# Altium footprint library lib_protel_HC_BOINA.PCBLIB: 726 footprints (part 21 of 46)
Each footprint in its own frame and in the unit in brackets; x right, y up, seen from the top. Pads: shape width x height; smd on the part's side, far side on the other; paste and mask are expansions set on the pad; w line width, h text height; cw(c..) or ccw(c..) is an arc to the next point about the centre after c.
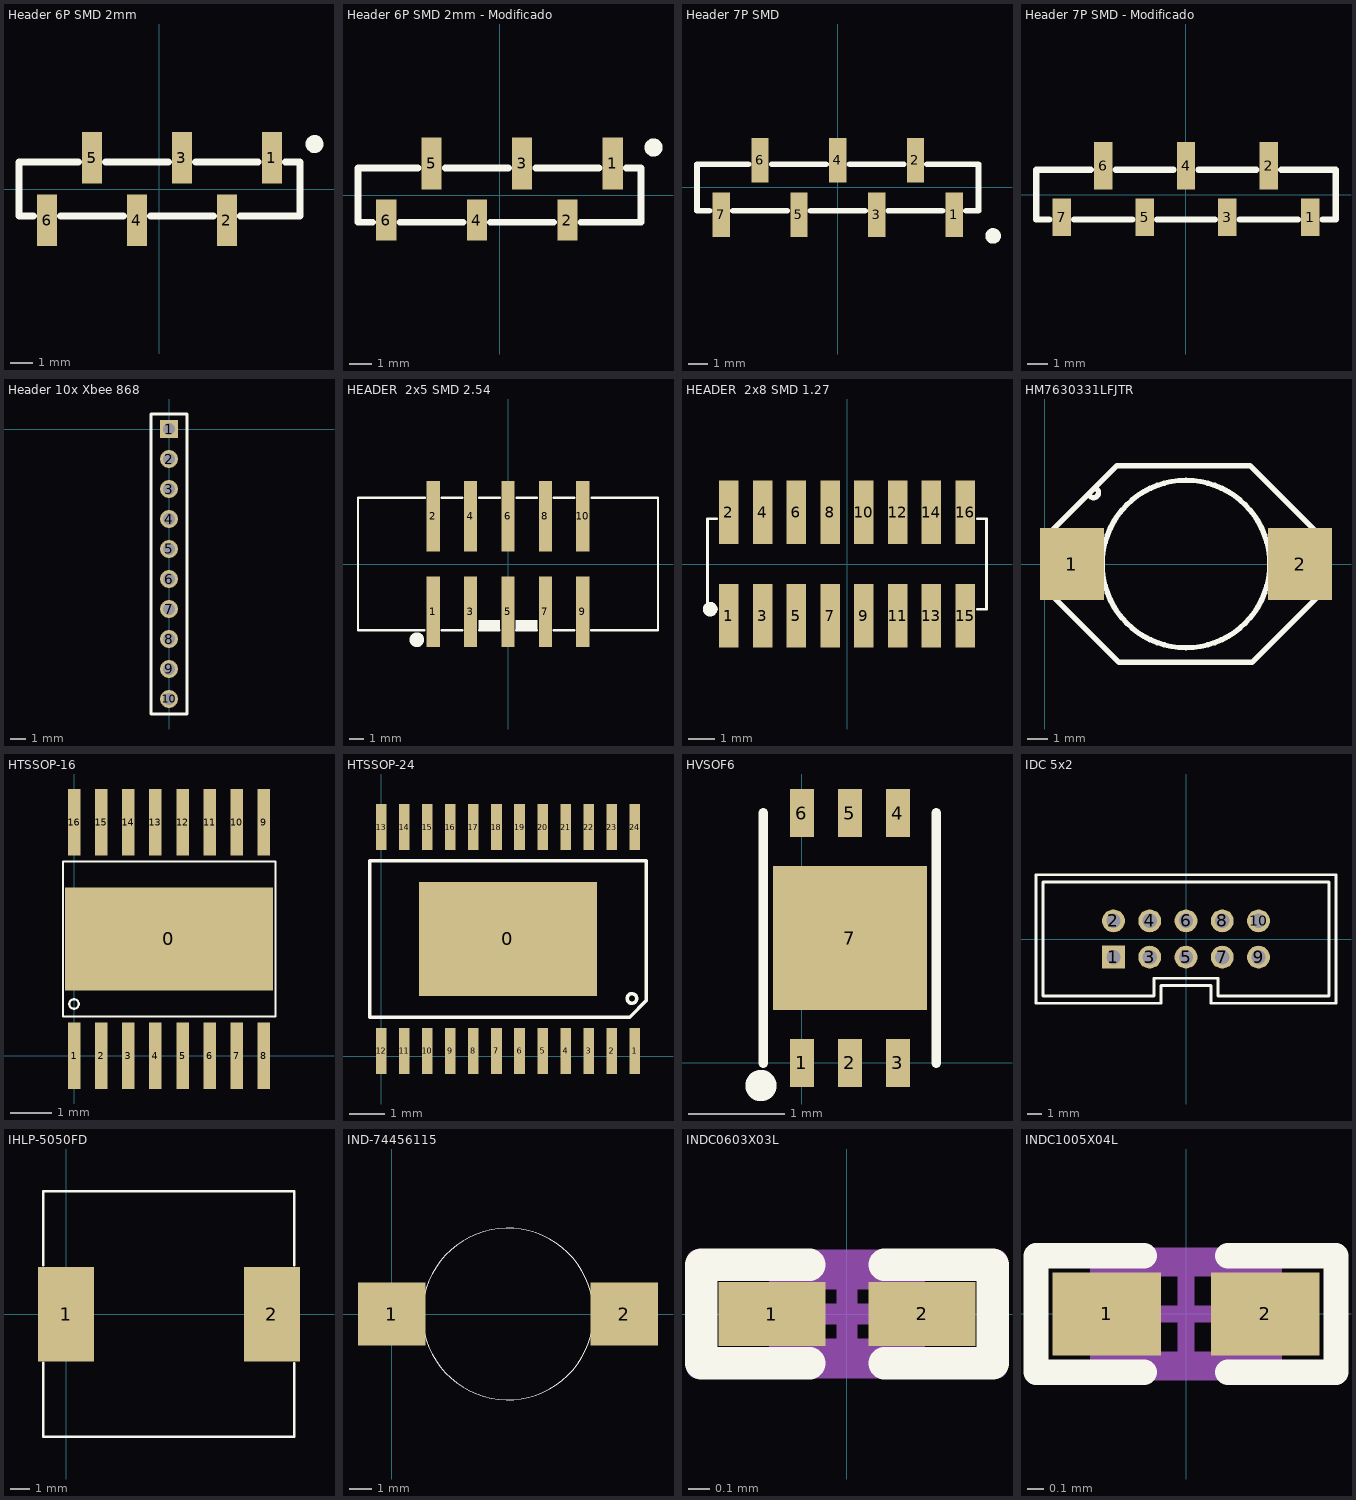
[diagram p20: the footprints below, top view; thin cyan lines are the x and y axes]

## Header 6P SMD 2mm [mm]
height 4.6
pads (6):
  rect 0.89x2.29 smd: 1(5,1.395) 2(3,-1.395) 3(1,1.395) 4(-1,-1.395) 5(-3,1.395) 6(-5,-1.395)
Top Overlay:
  circle w0.4: c6.9,2 r0.2
  lines w0.3: -6.25,1.2 -6.25,-1.2 -5.6,-1.2 ; -6.24,1.2 -3.6,1.2 ; -4.4,-1.2 -1.6,-1.2 ; -2.4,1.2 0.4,1.2 ; -0.4,-1.2 2.4,-1.2 ; 1.6,1.2 4.4,1.2 ; 3.6,-1.2 6.25,-1.2 6.25,1.2 5.6,1.2
3D body "Samtec-SMM-106-02-S-S.step": height 3.56, standoff -0.13, extent -5.997,-2.159 5.997,2.159

## Header 6P SMD 2mm - Modificado [mm]
height 4.6
pads (6):
  rect 0.89x2.29 smd: 1(5,1.395) 3(1,1.395) 5(-3,1.395)
  rect 0.89x1.8 smd: 2(3,-1.105) 4(-1,-1.105) 6(-5,-1.105)
Top Overlay:
  circle w0.4: c6.8,2.1 r0.2
  lines w0.3: -6.25,1.2 -6.25,-1.2 -5.6,-1.2 ; -6.24,1.2 -3.6,1.2 ; -4.4,-1.2 -1.6,-1.2 ; -2.4,1.2 0.4,1.2 ; -0.4,-1.2 2.4,-1.2 ; 1.6,1.2 4.4,1.2 ; 3.6,-1.2 6.25,-1.2 6.25,1.2 5.6,1.2
3D body "Samtec-SMM-106-02-S-S.step": height 3.56, standoff -0.13, extent -5.997,-2.159 5.997,2.159

## Header 7P SMD [mm]
height 4.6
pads (7):
  rect 0.89x2.29 smd: 1(6,-1.395) 2(4,1.395) 3(2,-1.395) 4(0,1.395) 5(-2,-1.395) 6(-4,1.395) 7(-6,-1.395)
Top Overlay:
  circle w0.4: c8,-2.495 r0.2
  lines w0.3: -7.25,1.2 -7.25,-1.2 -6.6,-1.2 ; -7.24,1.2 -4.6,1.2 ; -5.4,-1.2 -2.6,-1.2 ; -3.4,1.2 -0.6,1.2 ; -1.4,-1.2 1.4,-1.2 ; 0.6,1.2 3.4,1.2 ; 2.6,-1.2 5.4,-1.2 ; 4.6,1.2 7.24,1.2 7.24,-1.19 ; 6.6,-1.2 7.25,-1.2

## Header 7P SMD - Modificado [mm]
height 4.6
pads (7):
  rect 0.89x1.8 smd: 1(6,-1.095) 3(2,-1.095) 5(-2,-1.095) 7(-6,-1.095)
  rect 0.89x2.29 smd: 2(4,1.395) 4(0,1.395) 6(-4,1.395)
Top Overlay:
  lines w0.3: -7.25,-1.2 -6.6,-1.2 ; -7.24,-1.19 -7.24,1.2 -4.6,1.2 ; -5.4,-1.2 -2.6,-1.2 ; -3.4,1.2 -0.6,1.2 ; -1.4,-1.2 1.4,-1.2 ; 0.6,1.2 3.4,1.2 ; 2.6,-1.2 5.4,-1.2 ; 4.6,1.2 7.24,1.2 7.24,-1.19 ; 6.6,-1.2 7.25,-1.2
3D body "Samtec-SMM-107-02-F-S-K.step": height 3.84, standoff 0, extent -6.996,-2.159 6.996,2.159

## Header 10x Xbee 868 [mm] "Header Xbee 868MHz 10 pin - 2mm"
height 7.93
pads (10):
  rect 1.2x1.2 hole 0.8: 1(0,0)
  round 1.2 hole 0.8: 2(0,-2) 3(0,-4) 4(0,-6) 5(0,-8) 6(0,-10) 7(0,-12) 8(0,-14) 9(0,-16) 10(0,-18)
Top Overlay:
  lines w0.2: -1.2,-19 -1.2,1 1.2,1 1.2,-19 -1.2,-19
3D body "User Library-PBS2-10-1.STEP": height 4.3, standoff -3.15, extent -1,-19 1,1

## HEADER  2x5 SMD 2.54 [mm]
pads (10):
  rect 0.89x4.8 smd: 1(-5.08,-3.25) 2(-5.08,3.25) 3(-2.54,-3.25) 4(-2.54,3.25) 5(0,-3.25) 6(0,3.25) 7(2.54,-3.25) 8(2.54,3.25) 9(5.08,-3.25) 10(5.08,3.25)
Top Overlay:
  circle w0.5: c-6.2,-5.15 r0.25
  rectangle: -2,-4.5 -0.55,-3.8
  rectangle: 0.5,-4.5 2,-3.8
  lines w0.15: -5.7,-4.5 -10.2,-4.5 -10.2,4.5 -5.65,4.5 ; -4.5,-4.5 -3.1,-4.5 ; -4.5,4.5 -3.1,4.5 ; -1.95,-4.5 -0.6,-4.5 ; -1.95,4.5 -0.55,4.5 ; 0.55,-4.5 1.95,-4.5 ; 0.6,4.5 1.95,4.5 ; 3.1,-4.5 4.5,-4.5 ; 3.1,4.5 4.5,4.5 ; 5.65,-4.5 10.2,-4.5 10.2,4.5 5.7,4.5
3D body "header_awhw10g-smd.stp": height 10.65, standoff 0.01, extent -10.16,-4.725 10.16,4.775

## HEADER  2x8 SMD 1.27 [mm]
pads (16):
  rect 0.74x2.4 smd: 1(-4.445,-1.95) 2(-4.445,1.95) 3(-3.175,-1.95) 4(-3.175,1.95) 5(-1.905,-1.95) 6(-1.905,1.95) 7(-0.635,-1.95) 8(-0.635,1.95) 9(0.635,-1.95) 10(0.635,1.95) 11(1.905,-1.95) 12(1.905,1.95) 13(3.175,-1.95) 14(3.175,1.95) 15(4.445,-1.95) 16(4.445,1.95)
Top Overlay:
  circle w0.25: c-5.15,-1.7 r0.15
  lines w0.1: -4.9,-1.7 -5.25,-1.7 -5.25,1.7 -4.9,1.7 ; 4.9,-1.7 5.25,-1.7 5.25,1.7 4.9,1.7

## HM7630331LFJTR [mm] "BOBINA"
height 5.9
pads (2):
  rect 3.05x3.43 smd mask+0.1: 1(1.3,0) 2(12.2,0)
Top Overlay:
  circle w0.254: c6.75,0 r4
  lines w0.254: 2.108,3.353 ccw(c2.337,3.404) 2.451,3.608 ; 0,-1.143 0,0 0,1.245 3.455,4.7 9.803,4.7 13.5,1.003 13.5,-1.105 9.905,-4.7 3.557,-4.7 0,-1.143

## HTSSOP-16 [mm] "HTSSOP-16 para TPS40055"
height 1.2
pads (17):
  rect 5x2.46 smd mask+0.5: 0(2.275,2.8)
  rect 0.3x1.6 smd mask+0.07: 1(0,0) 2(0.65,0) 3(1.3,0) 4(1.95,0) 5(2.6,0) 6(3.25,0) 7(3.9,0) 8(4.55,0) 9(4.55,5.6) 10(3.9,5.6) 11(3.25,5.6) 12(2.6,5.6) 13(1.95,5.6) 14(1.3,5.6) 15(0.65,5.6) 16(0,5.6)
Top Overlay:
  circle w0.051: c-0.004,1.24 r0.114
  lines w0.051: -0.27,0.94 4.83,0.94 4.83,4.66 -0.27,4.66 -0.27,0.94

## HTSSOP-24 [mm] "HTSSOP-24 para TDA7493"
height 1.2
pads (25):
  rect 5x3.2 smd: 0(3.575,3.3)
  rect 0.3x1.3 smd: 1(7.15,0.15) 2(6.5,0.15) 3(5.85,0.15) 4(5.2,0.15) 5(4.55,0.15) 6(3.9,0.15) 7(3.25,0.15) 8(2.6,0.15) 9(1.95,0.15) 10(1.3,0.15) 11(0.65,0.15) 12(0,0.15) 13(0,6.45) 14(0.65,6.45) 15(1.3,6.45) 16(1.95,6.45) 17(2.6,6.45) 18(3.25,6.45) 19(3.9,6.45) 20(4.55,6.45) 21(5.2,6.45) 22(5.85,6.45) 23(6.5,6.45) 24(7.15,6.45)
Top Overlay:
  circle w0.1: c7.065,1.625 r0.135
  lines w0.1: -0.325,1.1 -0.325,5.5 7.475,5.5 7.475,1.575 7,1.1 -0.325,1.1

## HVSOF6 [mm] "REG BD18IC0WHFV"
height 0.75
pads (7):
  rect 0.25x0.5 smd: 1(0,0) 2(0.5,0) 3(1,0) 4(1,2.6) 5(0.5,2.6) 6(0,2.6)
  rect 1.6x1.5 smd: 7(0.5,1.3)
Top Overlay:
  circle w0.254: c-0.425,-0.235 r0.035
  lines w0.1: -0.4,0 -0.4,2.6 ; 1.4,0 1.4,2.6
3D body "29169.stp": height 0.75, standoff -0.02, extent -0.31,-0.2 1.31,2.8

## IDC 5x2 [mm]
pads (10):
  rect 1.6x1.6 hole 1: 1(-5.08,-1.27)
  round 1.6 hole 1: 2(-5.08,1.27) 3(-2.54,-1.27) 4(-2.54,1.27) 5(0,-1.27) 6(0,1.27) 7(2.54,-1.27) 8(2.54,1.27) 9(5.08,-1.27) 10(5.08,1.27)
Top Overlay:
  lines w0.2: 10,-2.75 10,4 -10,4 -10,-3.75 -10,-4 -2.25,-4 -2.25,-2.75 2.25,-2.75 2.25,-4 10,-4 10,-2.25 ; -10.5,-4.5 -1.75,-4.5 -1.75,-3.25 1.75,-3.25 1.75,-4.5 10.15,-4.5 10.5,-4.5 10.5,4.5 -10.5,4.5 -10.5,-4.5

## IHLP-5050FD [mm]
height 6.5
pads (2):
  rect 2.945x4.95 smd mask+0: 1(0,0) 2(10.815,0)
Top Overlay:
  lines w0.127: -1.21,-2.56 -1.21,-6.44 11.99,-6.44 11.99,-2.57 ; -1.21,2.57 -1.21,6.46 11.99,6.46 11.99,2.57

## IND-74456115 [mm] "INDUCTOR 15uH WURTH"
height 5
pads (2):
  rect 3x2.8 smd: 1(0,0) 2(10.3,0)
Top Overlay:
  circle w0.051: c5.15,0 r3.8

## INDC0603X03L [mm]
pads (2):
  rect 0.5x0.3 smd: 1(-0.35,0) 2(0.35,0)
Top Overlay:
  lines w0.15: -0.175,-0.23 -0.68,-0.23 -0.68,0.23 -0.175,0.23 ; 0.175,-0.23 0.68,-0.23 0.68,0.23 0.175,0.23
Mechanical 13:
  lines w0.1: -0.315,-0.165 0.315,-0.165 0.315,0.165 -0.315,0.165 -0.315,-0.165
Mechanical 15:
  lines w0.1: -0.165,0 0.165,0 ; 0,-0.165 0,0.165 ; -0.7,-0.25 0.7,-0.25 0.7,0.25 -0.7,0.25 -0.7,-0.25
3D body: height 0.26, standoff -0.01, extent -0.31,-0.16 0.31,0.16

## INDC1005X04L [mm]
pads (2):
  rect 0.65x0.5 smd: 1(-0.475,0) 2(0.475,0)
Top Overlay:
  lines w0.152: -0.25,-0.35 -0.9,-0.35 -0.9,0.35 -0.25,0.35 ; 0.25,-0.35 0.9,-0.35 0.9,0.35 0.25,0.35
Mechanical 13:
  lines w0.1: -0.525,-0.275 -0.525,0.275 0.525,0.275 0.525,-0.275 -0.525,-0.275
Mechanical 15:
  lines w0.1: -0.275,0 0.275,0 ; 0,-0.275 0,0.275 ; -0.9,-0.35 0.9,-0.35 0.9,0.35 -0.9,0.35 -0.9,-0.35
3D body: height 0.5, standoff 0, extent -0.5,-0.3 0.5,0.3